# Altium footprint library Selex_PCBLib.PcbLib: 388 footprints (part 4 of 25)
Each footprint in its own frame and in the unit in brackets; x right, y up, seen from the top. Pads: shape width x height; smd on the part's side, far side on the other; paste and mask are expansions set on the pad; w line width, h text height; cw(c..) or ccw(c..) is an arc to the next point about the centre after c.
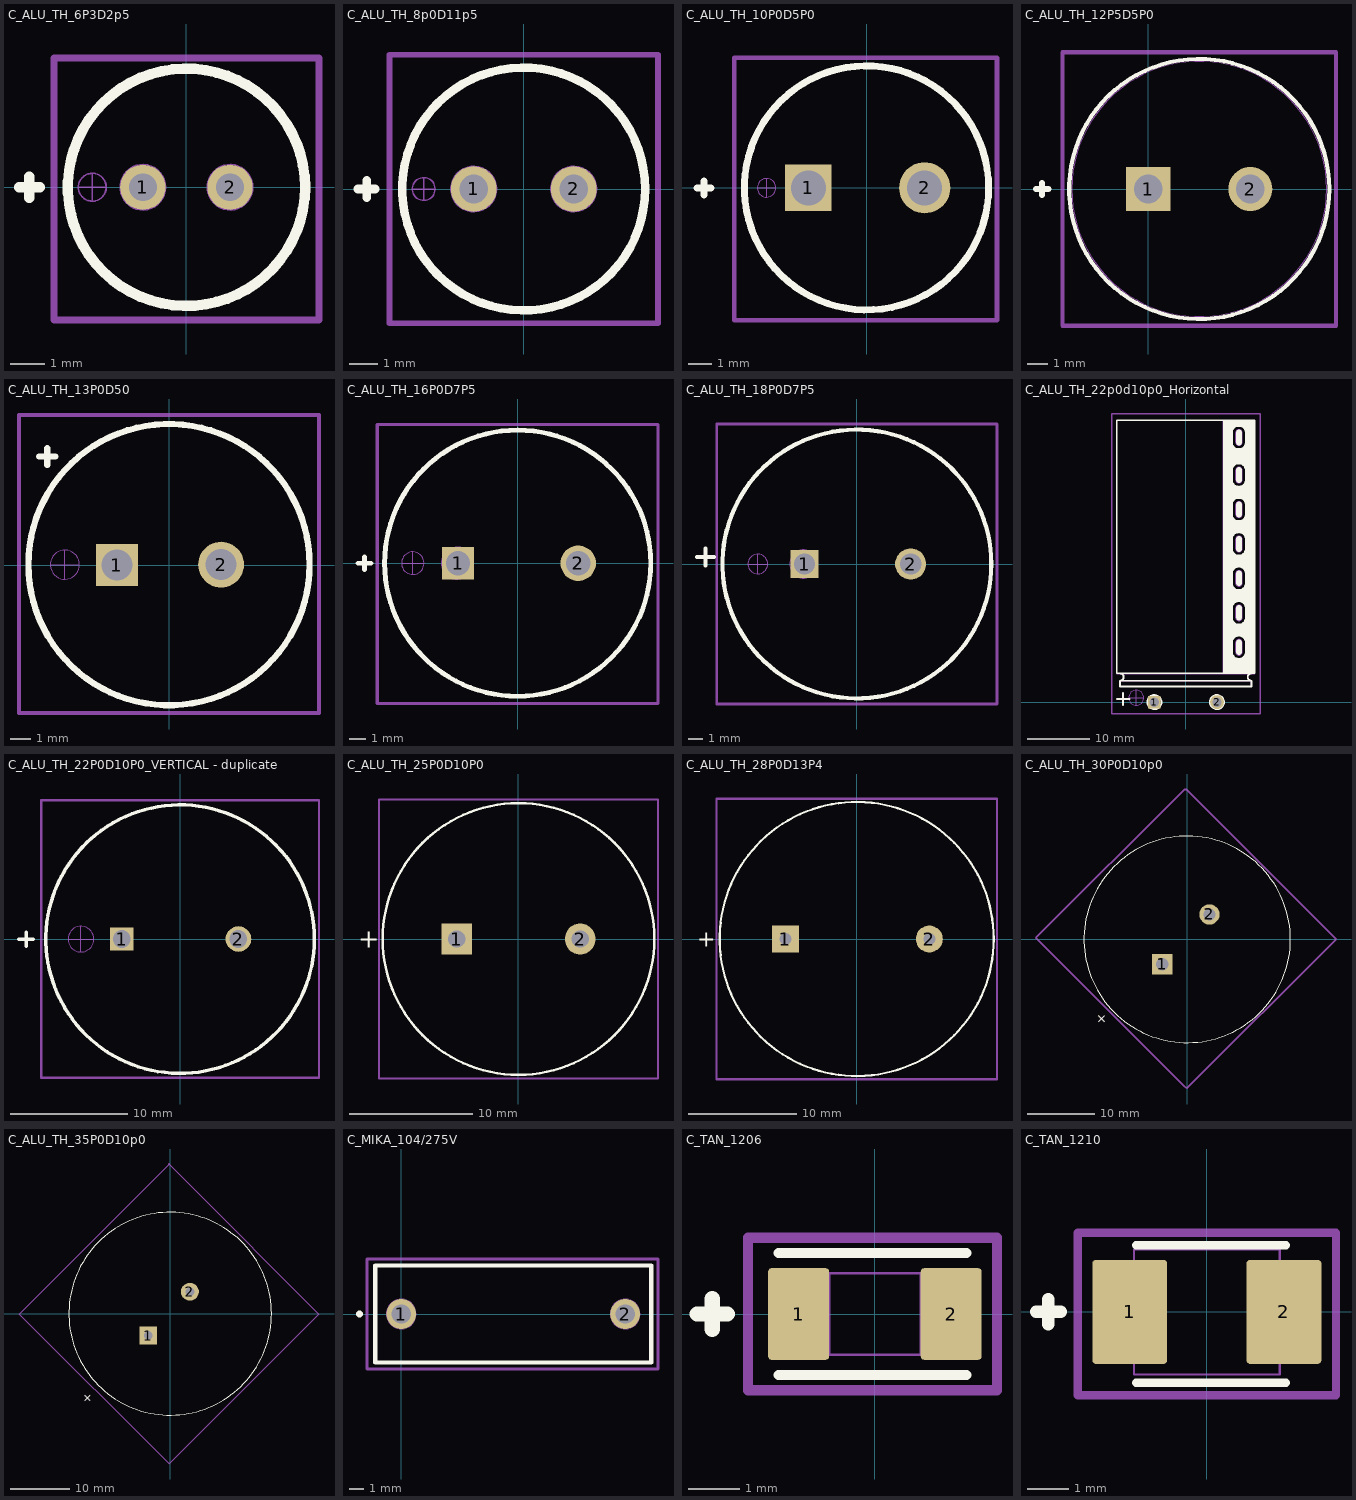
[diagram p3: the footprints below, top view; thin cyan lines are the x and y axes]

## C_ALU_TH_6P3D2p5 [mm] "Use for 33/47 uF Capacitor Through Hole"
pads (2):
  round 1.3 hole 0.8 mask+0.1: 1(-1.25,0) 2(1.25,0)
Top Overlay:
  circle w0.3: c0,0 r3.4
  lines w0.3: -4.8,0 -4.2,0 ; -4.5,-0.3 -4.5,0.3
Mechanical 1:
  circle w0.05: c-2.7,0 r0.4
  circle w0.05: c-1.25,0 r0.65
  circle w0.05: c1.25,0 r0.65
  circle w0.05: c0,0 r3.4
  lines w0.05: -3.1,0 -2.3,0 ; -2.7,-0.4 -2.7,0.4
Mechanical 15:
  lines w0.2: -3.8,-3.8 -3.8,3.7 3.8,3.7 3.8,-3.8 -3.8,-3.8
3D body "CAP6.3x11.step": height 11.03, standoff -3.51, extent -3.175,-3.175 3.175,3.175

## C_ALU_TH_8p0D11p5 [mm] "Use for 47uF Capacitor Through Hole"
pads (2):
  round 1.6 hole 1 mask+0.1: 1(-1.75,0) 2(1.75,0)
Top Overlay:
  circle w0.3: c0,0 r4.25
  lines w0.3: -5.8,0 -5.2,0 ; -5.5,-0.3 -5.5,0.3
Mechanical 1:
  circle w0.05: c0,0 r4.25
  circle w0.05: c1.75,0 r0.8
  circle w0.05: c-1.75,0 r0.8
  circle w0.05: c-3.5,0 r0.4
  lines w0.05: -3.9,0 -3.1,0 ; -3.5,-0.4 -3.5,0.4
Mechanical 15:
  lines w0.2: -4.7,-4.7 -4.7,4.7 4.7,4.7 4.7,-4.7 -4.7,-4.7
3D body "CAP8x11.5.step": height 11.53, standoff -3.98, extent -4.025,-4.025 4.025,4.025

## C_ALU_TH_10P0D5P0 [mm] "Use for 220uF Capacitor Through Hole( diameter 10 , pad distance :5)"
pads (2):
  rect 2x2 hole 1.5 mask+0.1: 1(-2.51,0)
  round 2.2 hole 1.5 mask+0.1: 2(2.49,0)
Top Overlay:
  circle w0.3: c-0.01,0 r5.25
  lines w0.3: -7.3,0 -6.7,0 ; -7,-0.3 -7,0.3
Mechanical 1:
  circle w0.05: c-4.31,0 r0.4
  circle w0.05: c-0.01,0 r5.25
  circle w0.05: c2.49,0 r0.8
  circle w0.05: c-2.51,0 r0.8
  lines w0.05: -4.71,0 -3.91,0 ; -4.31,-0.4 -4.31,0.4
Mechanical 15:
  lines w0.2: -5.7,-5.7 5.6,-5.7 5.6,5.6 -5.7,5.6 -5.7,-5.7
3D body "CAP10x16.step": height 16.03, standoff -4.24, extent -5.035,-5.025 5.015,5.025

## C_ALU_TH_12P5D5P0 [mil] "diameter 12 , pad distance :5"
pads (2):
  rect 85x85 / inner round 62 / far side round 62 hole 55 mask+0: 1(0,0)
  round 85 / inner round 62 / far side round 62 hole 55 mask+0: 2(196.85,0)
Top Overlay:
  circle w7.87: c98.43,0 r251
  lines w11.81: -216.54,0 -192.91,0 ; -204.72,-11.81 -204.72,11.81
Mechanical 13:
  circle w0: c98.43,0 r246
Mechanical 15:
  lines w7.87: -165.35,-263.78 -165.35,3.94 -165.35,263.78 362.2,263.78 362.2,-263.78 -165.35,-263.78
3D body: height 10, standoff 0, extent 0,0 10,10
3D body "CAP_UBY_12P5X31P5_NCH.step": height 1299.61, standoff -195.98, extent -147.08,-247 345,245

## C_ALU_TH_13P0D50 [mm] "Use for 330/470 uF Capacitor Through Hole diameter 13 , pad distance :5"
pads (2):
  rect 2x2 hole 1.5 mask+0.1: 1(-2.5,0)
  round 2.2 hole 1.5 mask+0.1: 2(2.5,0.02)
Top Overlay:
  circle w0.3: c0,0.02 r6.75
  lines w0.3: -6.242,5.207 -5.442,5.207 ; -5.842,4.807 -5.842,5.607
Mechanical 1:
  circle w0.05: c-5,0.02 r0.7
  circle w0.05: c-2.5,0.02 r0.8
  circle w0.05: c2.5,0.02 r0.8
  circle w0.05: c0,0.02 r6.75
  lines w0.05: -5.7,0.02 -4.3,0.02 ; -5,-0.68 -5,0.72
Mechanical 15:
  lines w0.2: -7.2,-7.1 -7.2,7.2 7.2,7.2 7.2,-7.1 -7.2,-7.1
3D body "CAP13x20.STEP": height 20.3, standoff -1.2, extent -6.498,-6.479 6.498,6.519

## C_ALU_TH_16P0D7P5 [mm] "Use for 1000uF Capacitor Through Hole diameter 16 , pad distance :7.5"
pads (3):
  rect 2x2 hole 1.5 mask+0.1: 1(-3.7,0)
  round 2 hole 1.3 mask+0.1: 2(3.75,0)
  round 2.2 hole 1.5 mask+0.1: 2(3.75,0)
Top Overlay:
  circle w0.3: c0,0 r8.25
  lines w0.3: -9.9,0 -9.1,0 ; -9.5,-0.4 -9.5,0.4
Mechanical 1:
  circle w0.05: c-6.5,0 r0.7
  circle w0.05: c-3.75,0 r1
  circle w0.05: c3.75,0 r1
  circle w0.05: c0,0 r8.25
  lines w0.05: -7.2,0 -5.8,0 ; -6.5,-0.7 -6.5,0.7
Mechanical 15:
  lines w0.2: -8.7,-8.7 -8.7,8.6 8.7,8.6 8.7,-8.7 -8.7,-8.7
3D body "CAP16x25.STEP": height 25.3, standoff -1.2, extent -7.997,-7.999 7.997,7.998

## C_ALU_TH_18P0D7P5 [mm] "Use for 2200uF Capacitor Through Hole diameter 18 , pad distance :7.5"
pads (2):
  rect 2x2 hole 1.5 mask+0.1: 1(-3.7,0)
  round 2.2 hole 1.5 mask+0.1: 2(3.8,0)
Top Overlay:
  circle w0.3: c0,0 r9.5
  lines w0.3: -11.3,0.5 -10.1,0.5 ; -10.7,-0.1 -10.7,1.1
Mechanical 1:
  circle w0.05: c-3.75,0 r1
  circle w0.05: c3.75,0 r1
  circle w0.05: c0,0 r9.5
  circle w0.05: c-7,0 r0.7
  lines w0.05: -7.7,0 -6.3,0 ; -7,-0.7 -7,0.7
Mechanical 15:
  lines w0.2: -9.9,-9.9 -9.9,9.9 9.9,9.9 9.9,-9.9 -9.9,-9.9
3D body "CAP16x25.STEP": height 25.3, standoff -1.2, extent -7.997,-7.999 7.997,7.998

## C_ALU_TH_22p0d10p0_Horizontal [mm] "diameter 2 , pad distance :10"
pads (2):
  rect 2x2 hole 1.5 mask+0.1: 1(-5,0)
  round 2.2 hole 1.5 mask+0.1: 2(5,0)
Top Overlay:
  drawing of 24 lines, arcs and shapes, not listed
Mechanical 1:
  circle w0.05: c5,0 r0.8
  circle w0.05: c-5,0 r0.8
  circle w0.05: c-7.9,0.7 r1.2
  lines w0.05: -10.16,4.494 cw(c-10.5,4) -10.5,3.4 ; -9.1,0.7 -6.7,0.7 ; -7.9,-0.5 -7.9,1.9 ; 6,4.5 6,45 ; 10.16,4.494 ccw(c10.5,4) 10.5,3.4 ; -10.5,3.4 -10.5,2.5 10.5,2.5 10.5,3.4 ; -10.5,3.4 10.5,3.4 ; 8,8 ccw(c8.5,8) 9,8 ; 8,8 ccw(c8.5,8) 9,8 ; 8,8 8,9.5 ; 8,8 8,9.5 ; 8,9.5 cw(c8.5,9.5) 9,9.5 ; 8,9.5 cw(c8.5,9.5) 9,9.5 ; 8,13.5 ccw(c8.5,13.5) 9,13.5 ; 8,13.5 ccw(c8.5,13.5) 9,13.5 ; 8,13.5 8,15 ; 8,13.5 8,15 ; 8,15 cw(c8.5,15) 9,15 ; 8,15 cw(c8.5,15) 9,15 ; 8,19 ccw(c8.5,19) 9,19 ; 8,19 ccw(c8.5,19) 9,19 ; 8,19 8,20.5 ; 8,19 8,20.5 ; 8,20.5 cw(c8.5,20.5) 9,20.5 ; 8,20.5 cw(c8.5,20.5) 9,20.5 ; 8,24.5 ccw(c8.5,24.5) 9,24.5 ; 8,24.5 ccw(c8.5,24.5) 9,24.5 ; 8,24.5 8,26 ; 8,24.5 8,26 ; 8,26 cw(c8.5,26) 9,26 ; 8,26 cw(c8.5,26) 9,26 ; 8,30 ccw(c8.5,30) 9,30 ; 8,30 ccw(c8.5,30) 9,30 ; 8,30 8,31.5 ; 8,30 8,31.5 ; 8,31.5 cw(c8.5,31.5) 9,31.5 ; 8,31.5 cw(c8.5,31.5) 9,31.5 ; 8,35.5 ccw(c8.5,35.5) 9,35.5 ; 8,35.5 ccw(c8.5,35.5) 9,35.5 ; 8,35.5 8,37 ; 8,35.5 8,37 ; 8,37 cw(c8.5,37) 9,37 ; 8,37 cw(c8.5,37) 9,37 ; 8,41.5 ccw(c8.5,41.5) 9,41.5 ; 8,41.5 ccw(c8.5,41.5) 9,41.5 ; 8,41.5 8,43 ; 8,41.5 8,43 ; 8,43 cw(c8.5,43) 9,43 ; 8,43 cw(c8.5,43) 9,43 ; 9,8 9,9.5 ; 9,8 9,9.5 ; 9,13.5 9,15 ; 9,13.5 9,15 ; 9,19 9,20.5 ; 9,19 9,20.5 ; 9,24.5 9,26 ; 9,24.5 9,26 ; 9,30 9,31.5 ; 9,30 9,31.5 ; 9,35.5 9,37 ; 9,35.5 9,37 ; 9,41.5 9,43 ; 9,41.5 9,43 ; -11,4.5 11,4.5 11,45 -11,45 -11,4.5
Mechanical 15:
  lines w0.2: -11.8,-1.9 -11.8,46 11.9,46 11.9,-1.9 -11.8,-1.9
3D body "CAP22x40.STEP": height 22.5, standoff 0.5, extent -10.846,3.45 11.146,44.95

## C_ALU_TH_22P0D10P0_VERTICAL - duplicate [mm] "diameter 2 , pad distance :10"
pads (2):
  rect 2x2 hole 1.5 mask+0.1: 1(-5,0)
  round 2.2 hole 1.5 mask+0.1: 2(5,0)
Top Overlay:
  circle w0.3: c0,-0.01 r11.5
  lines w0.3: -13.8,-0.01 -12.6,-0.01 ; -13.2,-0.61 -13.2,0.59
Mechanical 1:
  circle w0.05: c5,-0.01 r0.8
  circle w0.05: c-5,-0.01 r0.8
  circle w0.05: c0,-0.01 r11.5
  circle w0.05: c-8.5,-0.01 r1.1
  lines w0.05: -9.6,-0.01 -7.4,-0.01 ; -8.5,-1.11 -8.5,1.09
Mechanical 15:
  lines w0.2: -11.9,-11.9 -11.9,11.9 11.9,11.9 11.9,-11.9 -11.9,-11.9
3D body "CAP22x40.STEP": height 40.3, standoff -1.2, extent -10.996,-10.999 10.996,10.998

## C_ALU_TH_25P0D10P0 [mm] "diameter 25, pad distance :10"
pads (2):
  rect 2.5x2.5 / inner rrect50% 2.5x2.5 / far side rect 2.5x2.5 hole 1.4: 1(-5,0)
  round 2.5 / inner rrect50% 2.5x2.5 / far side round 2.5 hole 1.4: 2(5,0)
Top Overlay:
  circle w0.2: c0,0 r11
  text "+" at -13,-0.7 h1.5
Mechanical 15:
  lines w0.2: -0.7,11.3 11.3,11.3 11.3,-11.3 -11.3,-11.3 -11.3,11.3 -0.5,11.3
3D body "22x41x10x0.8.stp": height 18.91, standoff -42.31, extent -11,-10.996 10.99,11

## C_ALU_TH_28P0D13P4 [mm] "diameter 28 , pad distance :13.4"
pads (2):
  rect 2.5x2.5 / inner rrect50% 2.5x2.5 / far side rect 2.5x2.5 hole 1.1: 1(-6.604,0)
  round 2.5 / inner rrect50% 2.5x2.5 / far side round 2.5 hole 1.1: 2(6.731,0)
Top Overlay:
  circle w0.2: c0,0 r12.7
  text "+" at -14.8,-0.7 h1.5
Mechanical 15:
  lines w0.2: -13,-13 13,-13 13,13 -0.2,13 -13,13 -13,-13
3D body "25x40.step": height 1.2, standoff -43.5, extent -12.7,-12.7 12.7,12.7

## C_ALU_TH_30P0D10p0 [mm] "diameter 30 , pad distance :10"
pads (2):
  rect 3x3 hole 1.8: 1(-3.683,-3.683)
  round 3 hole 1.8: 2(3.302,3.683)
Top Overlay:
  circle w0.127: c0,0 r15.3
  text "+" at -12.8,-12.9 h1.5
Mechanical 15:
  lines w0.2: -0.4,22.2 -22.4,0.2 -0.4,-21.8 -0.1,-22.1 22.05,0.05 -0.1,22.2
  lines w0.254: -0.4,22.2 -0.1,22.2
3D body "30x50.STEP": height 5.59, standoff -52.1, extent -21.806,-21.425 21.298,21.679

## C_ALU_TH_35P0D10p0 [mm] "diameter 35 , pad distance :10"
pads (2):
  rect 3x3 hole 1.5: 1(-3.683,-3.683)
  round 3 hole 1.5: 2(3.302,3.683)
Top Overlay:
  circle w0.127: c0,0 r17
  text "+" at -14,-15.3 h1.5
Mechanical 15:
  lines w0.2: -0.2,25.1 -25.35,-0.05 -0.2,-25.2 24.95,-0.05 2.75,22.15
  lines w0.254: -0.2,25.1 2.75,22.15
3D body "30x35.STEP": height 4.32, standoff -33.5, extent -24.89,-24.734 24.607,24.763

## C_MIKA_104/275V [mm] "though, 2pin 15.5mm."
pads (2):
  round 2 hole 1.3 mask+0.1: 1(0,0) 2(15,0)
Top Overlay:
  circle w0.254: c-2.8,0 r0.1
  lines w0.3: -1.75,-3.25 -1.75,3.25 16.75,3.25 16.75,-3.25 -1.75,-3.25
Mechanical 1:
  circle w0.05: c0,0 r1
  circle w0.05: c15,0 r1
  lines w0.05: -1.75,-3.25 -1.75,3.25 16.75,3.25 16.75,-3.25 -1.75,-3.25
  text "1" at -0.1,-0.3 h0.8
  text "2" at 14.7,-0.3 h0.8
Mechanical 15:
  lines w0.2: -2.3,-3.7 17.2,-3.7 17.2,3.7 -2.3,3.7 -2.3,0 -2.3,-3.7
3D body "User Library-CAP FILM 0_1UF 560VDC RADIAL.step": height 11.5, standoff -9, extent -1.5,-2.4 16.5,2.6

## C_TAN_1206 [mm] "Tantalum Capacitor 1206"
pads (2):
  rrect10% 1.2x1.8 smd mask+0.1: 1(-1.5,0) 2(1.5,0)
Top Overlay:
  lines w0.2: -1.9,-1.2 1.8,-1.2 ; -1.9,1.2 1.8,1.2
  lines w0.3: -3.5,0 -2.9,0 ; -3.2,-0.3 -3.2,0.3
Mechanical 1:
  lines w0.05: -0.9,-0.8 -0.9,0.8 ; 0.9,-0.8 0.9,0.8 ; -1.6,-0.8 -1.6,0.8 1.6,0.8 1.6,-0.8 -1.6,-0.8
Mechanical 15:
  lines w0.2: -2.5,-1.5 -2.5,1.5 2.4,1.5 2.4,-1.5 -2.5,-1.5
3D body "CAPTAN3216.step": height 1.7, standoff 0, extent -1.7,-0.9 1.7,0.9

## C_TAN_1210 [mm] "Tantalum Capacitor 1210"
pads (2):
  rrect10% 1.8x2.5 smd mask+0.1: 1(-1.85,0) 2(1.85,0)
Top Overlay:
  lines w0.2: -1.7,-1.7 1.9,-1.7 ; -1.7,1.6 1.9,1.6
  lines w0.3: -4.1,0 -3.5,0 ; -3.8,-0.3 -3.8,0.3
Mechanical 1:
  lines w0.05: -1.75,-1.5 -1.75,1.5 -1.169,1.5 0.444,1.5 1.75,1.5 1.75,-1.5 -1.75,-1.5
Mechanical 15:
  lines w0.2: -3.1,-2 -3.1,1.9 -2,1.9 3.1,1.9 3.1,-2 -3.1,-2
3D body "75453.stp": height 2.11, standoff 0.01, extent -1.75,-1.6 1.95,1.4